# Altium footprint library con-samtec.PCBLIB: 805 footprints (part 46 of 55) (continued)
## TSW-139-02-S-Q [mm] (continued)
  rectangle: 12.35,2.19 13.05,2.89
  rectangle: 14.89,-2.89 15.59,-2.19
  rectangle: 14.89,2.19 15.59,2.89
  rectangle: 17.43,-2.89 18.13,-2.19
  rectangle: 17.43,2.19 18.13,2.89
  rectangle: 19.97,-2.89 20.67,-2.19
  rectangle: 19.97,2.19 20.67,2.89
  rectangle: 22.51,-2.89 23.21,-2.19
  rectangle: 22.51,2.19 23.21,2.89
  rectangle: 25.05,-2.89 25.75,-2.19
  rectangle: 25.05,2.19 25.75,2.89
  rectangle: 27.59,-2.89 28.29,-2.19
  rectangle: 27.59,2.19 28.29,2.89
  rectangle: 30.13,-2.89 30.83,-2.19
  rectangle: 30.13,2.19 30.83,2.89
  rectangle: 32.67,-2.89 33.37,-2.19
  rectangle: 32.67,2.19 33.37,2.89
  rectangle: 35.21,-2.89 35.91,-2.19
  rectangle: 35.21,2.19 35.91,2.89
  rectangle: 37.75,-2.89 38.45,-2.19
  rectangle: 37.75,2.19 38.45,2.89
  rectangle: 40.29,-2.89 40.99,-2.19
  rectangle: 40.29,2.19 40.99,2.89
  rectangle: 42.83,-2.89 43.53,-2.19
  rectangle: 42.83,2.19 43.53,2.89
  rectangle: 45.37,-2.89 46.07,-2.19
  rectangle: 45.37,2.19 46.07,2.89
  rectangle: 47.91,-2.89 48.61,-2.19
  rectangle: 47.91,2.19 48.61,2.89

## TSW-139-02-S-Q-RA [mil]
pads (78):
  oct 59.06x59.06 hole 39.37: 1(1900,60) 2(1900,260) 3(1800,60) 4(1800,260) 5(1700,60) 6(1700,260) 7(1600,60) 8(1600,260) 9(1500,60) 10(1500,260) 11(1400,60) 12(1400,260) 13(1300,60) 14(1300,260) 15(1200,60) 16(1200,260) 17(1100,60) 18(1100,260) 19(1000,60) 20(1000,260) 21(900,60) 22(900,260) 23(800,60) 24(800,260) 25(700,60) 26(700,260) 27(600,60) 28(600,260) 29(500,60) 30(500,260) 31(400,60) 32(400,260) 33(300,60) 34(300,260) 35(200,60) 36(200,260) 37(100,60) 38(100,260) 39(0,60) 40(0,260) 41(-100,60) 42(-100,260) 43(-200,60) 44(-200,260) 45(-300,60) 46(-300,260) 47(-400,60) 48(-400,260) 49(-500,60) 50(-500,260) 51(-600,60) 52(-600,260) 53(-700,60) 54(-700,260) 55(-800,60) 56(-800,260) 57(-900,60) 58(-900,260) 59(-1000,60) 60(-1000,260) 61(-1100,60) 62(-1100,260) 63(-1200,60) 64(-1200,260) 65(-1300,60) 66(-1300,260) 67(-1400,60) 68(-1400,260) 69(-1500,60) 70(-1500,260) 71(-1600,60) 72(-1600,260) 73(-1700,60) 74(-1700,260) 75(-1800,60) 76(-1800,260) 77(-1900,60) 78(-1900,260)
Top Overlay:
  rectangle: -1910,-310.63 -1890,-80.32
  rectangle: -1810,-310.63 -1790,-80.32
  rectangle: -1710,-310.63 -1690,-80.32
  rectangle: -1610,-310.63 -1590,-80.32
  rectangle: -1510,-310.63 -1490,-80.32
  rectangle: -1410,-310.63 -1390,-80.32
  rectangle: -1310,-310.63 -1290,-80.32
  rectangle: -1210,-310.63 -1190,-80.32
  rectangle: -1110,-310.63 -1090,-80.32
  rectangle: -1010,-310.63 -990,-80.32
  rectangle: -910,-310.63 -890,-80.32
  rectangle: -810,-310.63 -790,-80.32
  rectangle: -710,-310.63 -690,-80.32
  rectangle: -610,-310.63 -590,-80.32
  rectangle: -510,-310.63 -490,-80.32
  rectangle: -410,-310.63 -390,-80.32
  rectangle: -310,-310.63 -290,-80.32
  rectangle: -210,-310.63 -190,-80.32
  rectangle: -110,-310.63 -90,-80.32
  rectangle: -10,-310.63 10,-80.32
  rectangle: 90,-310.63 110,-80.32
  rectangle: 190,-310.63 210,-80.32
  rectangle: 290,-310.63 310,-80.32
  rectangle: 390,-310.63 410,-80.32
  rectangle: 490,-310.63 510,-80.32
  rectangle: 590,-310.63 610,-80.32
  rectangle: 690,-310.63 710,-80.32
  rectangle: 790,-310.63 810,-80.32
  rectangle: 890,-310.63 910,-80.32
  rectangle: 990,-310.63 1010,-80.32
  rectangle: 1090,-310.63 1110,-80.32
  rectangle: 1190,-310.63 1210,-80.32
  rectangle: 1290,-310.63 1310,-80.32
  rectangle: 1390,-310.63 1410,-80.32
  rectangle: 1490,-310.63 1510,-80.32
  rectangle: 1590,-310.63 1610,-80.32
  rectangle: 1690,-310.63 1710,-80.32
  rectangle: 1790,-310.63 1810,-80.32
  rectangle: 1890,-310.63 1910,-80.32
  lines w8: -1955.08,-80.55 1955.08,-80.55 1955.08,-4.17 -1955.08,-4.17 -1955.08,-80.55
  text "1" at 1953.54,43.31 h36.81
  text "2" at 1951.18,242.72 h36.81
Mechanical 16:
  rectangle: -1910,0 -1890,270
  rectangle: -1810,0 -1790,270
  rectangle: -1710,0 -1690,270
  rectangle: -1610,0 -1590,270
  rectangle: -1510,0 -1490,270
  rectangle: -1410,0 -1390,270
  rectangle: -1310,0 -1290,270
  rectangle: -1210,0 -1190,270
  rectangle: -1110,0 -1090,270
  rectangle: -1010,0 -990,270
  rectangle: -910,0 -890,270
  rectangle: -810,0 -790,270
  rectangle: -710,0 -690,270
  rectangle: -610,0 -590,270
  rectangle: -510,0 -490,270
  rectangle: -410,0 -390,270
  rectangle: -310,0 -290,270
  rectangle: -210,0 -190,270
  rectangle: -110,0 -90,270
  rectangle: -10,0 10,270
  rectangle: 90,0 110,270
  rectangle: 190,0 210,270
  rectangle: 290,0 310,270
  rectangle: 390,0 410,270
  rectangle: 490,0 510,270
  rectangle: 590,0 610,270
  rectangle: 690,0 710,270
  rectangle: 790,0 810,270
  rectangle: 890,0 910,270
  rectangle: 990,0 1010,270
  rectangle: 1090,0 1110,270
  rectangle: 1190,0 1210,270
  rectangle: 1290,0 1310,270
  rectangle: 1390,0 1410,270
  rectangle: 1490,0 1510,270
  rectangle: 1590,0 1610,270
  rectangle: 1690,0 1710,270
  rectangle: 1790,0 1810,270
  rectangle: 1890,0 1910,270

## TSW-139-02-S-S [mm]
pads (39):
  oct 1.5x1.5 hole 1: 1(48.26,0) 2(45.72,0) 3(43.18,0) 4(40.64,0) 5(38.1,0) 6(35.56,0) 7(33.02,0) 8(30.48,0) 9(27.94,0) 10(25.4,0) 11(22.86,0) 12(20.32,0) 13(17.78,0) 14(15.24,0) 15(12.7,0) 16(10.16,0) 17(7.62,0) 18(5.08,0) 19(2.54,0) 20(0,0) 21(-2.54,0) 22(-5.08,0) 23(-7.62,0) 24(-10.16,0) 25(-12.7,0) 26(-15.24,0) 27(-17.78,0) 28(-20.32,0) 29(-22.86,0) 30(-25.4,0) 31(-27.94,0) 32(-30.48,0) 33(-33.02,0) 34(-35.56,0) 35(-38.1,0) 36(-40.64,0) 37(-43.18,0) 38(-45.72,0) 39(-48.26,0)
Top Overlay:
  lines w0.203: -49.659,-1.155 49.659,-1.155 49.659,1.155 -49.659,1.155 -49.659,-1.155
  text "1" at 48.002,-2.498 h0.94
Mechanical 16:
  rectangle: -48.61,-0.35 -47.91,0.35
  rectangle: -46.07,-0.35 -45.37,0.35
  rectangle: -43.53,-0.35 -42.83,0.35
  rectangle: -40.99,-0.35 -40.29,0.35
  rectangle: -38.45,-0.35 -37.75,0.35
  rectangle: -35.91,-0.35 -35.21,0.35
  rectangle: -33.37,-0.35 -32.67,0.35
  rectangle: -30.83,-0.35 -30.13,0.35
  rectangle: -28.29,-0.35 -27.59,0.35
  rectangle: -25.75,-0.35 -25.05,0.35
  rectangle: -23.21,-0.35 -22.51,0.35
  rectangle: -20.67,-0.35 -19.97,0.35
  rectangle: -18.13,-0.35 -17.43,0.35
  rectangle: -15.59,-0.35 -14.89,0.35
  rectangle: -13.05,-0.35 -12.35,0.35
  rectangle: -10.51,-0.35 -9.81,0.35
  rectangle: -7.97,-0.35 -7.27,0.35
  rectangle: -5.43,-0.35 -4.73,0.35
  rectangle: -2.89,-0.35 -2.19,0.35
  rectangle: -0.35,-0.35 0.35,0.35
  rectangle: 2.19,-0.35 2.89,0.35
  rectangle: 4.73,-0.35 5.43,0.35
  rectangle: 7.27,-0.35 7.97,0.35
  rectangle: 9.81,-0.35 10.51,0.35
  rectangle: 12.35,-0.35 13.05,0.35
  rectangle: 14.89,-0.35 15.59,0.35
  rectangle: 17.43,-0.35 18.13,0.35
  rectangle: 19.97,-0.35 20.67,0.35
  rectangle: 22.51,-0.35 23.21,0.35
  rectangle: 25.05,-0.35 25.75,0.35
  rectangle: 27.59,-0.35 28.29,0.35
  rectangle: 30.13,-0.35 30.83,0.35
  rectangle: 32.67,-0.35 33.37,0.35
  rectangle: 35.21,-0.35 35.91,0.35
  rectangle: 37.75,-0.35 38.45,0.35
  rectangle: 40.29,-0.35 40.99,0.35
  rectangle: 42.83,-0.35 43.53,0.35
  rectangle: 45.37,-0.35 46.07,0.35
  rectangle: 47.91,-0.35 48.61,0.35

## TSW-139-02-S-S-RA [mil]
pads (39):
  oct 59.06x59.06 hole 39.37: 1(1900,60) 2(1800,60) 3(1700,60) 4(1600,60) 5(1500,60) 6(1400,60) 7(1300,60) 8(1200,60) 9(1100,60) 10(1000,60) 11(900,60) 12(800,60) 13(700,60) 14(600,60) 15(500,60) 16(400,60) 17(300,60) 18(200,60) 19(100,60) 20(0,60) 21(-100,60) 22(-200,60) 23(-300,60) 24(-400,60) 25(-500,60) 26(-600,60) 27(-700,60) 28(-800,60) 29(-900,60) 30(-1000,60) 31(-1100,60) 32(-1200,60) 33(-1300,60) 34(-1400,60) 35(-1500,60) 36(-1600,60) 37(-1700,60) 38(-1800,60) 39(-1900,60)
Top Overlay:
  rectangle: -1910,-310.63 -1890,-80.32
  rectangle: -1810,-310.63 -1790,-80.32
  rectangle: -1710,-310.63 -1690,-80.32
  rectangle: -1610,-310.63 -1590,-80.32
  rectangle: -1510,-310.63 -1490,-80.32
  rectangle: -1410,-310.63 -1390,-80.32
  rectangle: -1310,-310.63 -1290,-80.32
  rectangle: -1210,-310.63 -1190,-80.32
  rectangle: -1110,-310.63 -1090,-80.32
  rectangle: -1010,-310.63 -990,-80.32
  rectangle: -910,-310.63 -890,-80.32
  rectangle: -810,-310.63 -790,-80.32
  rectangle: -710,-310.63 -690,-80.32
  rectangle: -610,-310.63 -590,-80.32
  rectangle: -510,-310.63 -490,-80.32
  rectangle: -410,-310.63 -390,-80.32
  rectangle: -310,-310.63 -290,-80.32
  rectangle: -210,-310.63 -190,-80.32
  rectangle: -110,-310.63 -90,-80.32
  rectangle: -10,-310.63 10,-80.32
  rectangle: 90,-310.63 110,-80.32
  rectangle: 190,-310.63 210,-80.32
  rectangle: 290,-310.63 310,-80.32
  rectangle: 390,-310.63 410,-80.32
  rectangle: 490,-310.63 510,-80.32
  rectangle: 590,-310.63 610,-80.32
  rectangle: 690,-310.63 710,-80.32
  rectangle: 790,-310.63 810,-80.32
  rectangle: 890,-310.63 910,-80.32
  rectangle: 990,-310.63 1010,-80.32
  rectangle: 1090,-310.63 1110,-80.32
  rectangle: 1190,-310.63 1210,-80.32
  rectangle: 1290,-310.63 1310,-80.32
  rectangle: 1390,-310.63 1410,-80.32
  rectangle: 1490,-310.63 1510,-80.32
  rectangle: 1590,-310.63 1610,-80.32
  rectangle: 1690,-310.63 1710,-80.32
  rectangle: 1790,-310.63 1810,-80.32
  rectangle: 1890,-310.63 1910,-80.32
  lines w8: -1955.08,-80.55 1955.08,-80.55 1955.08,-4.17 -1955.08,-4.17 -1955.08,-80.55
  text "1" at 1950.47,45.35 h36.81
Mechanical 16:
  rectangle: -1910,0 -1890,70
  rectangle: -1810,0 -1790,70
  rectangle: -1710,0 -1690,70
  rectangle: -1610,0 -1590,70
  rectangle: -1510,0 -1490,70
  rectangle: -1410,0 -1390,70
  rectangle: -1310,0 -1290,70
  rectangle: -1210,0 -1190,70
  rectangle: -1110,0 -1090,70
  rectangle: -1010,0 -990,70
  rectangle: -910,0 -890,70
  rectangle: -810,0 -790,70
  rectangle: -710,0 -690,70
  rectangle: -610,0 -590,70
  rectangle: -510,0 -490,70
  rectangle: -410,0 -390,70
  rectangle: -310,0 -290,70
  rectangle: -210,0 -190,70
  rectangle: -110,0 -90,70
  rectangle: -10,0 10,70
  rectangle: 90,0 110,70
  rectangle: 190,0 210,70
  rectangle: 290,0 310,70
  rectangle: 390,0 410,70
  rectangle: 490,0 510,70
  rectangle: 590,0 610,70
  rectangle: 690,0 710,70
  rectangle: 790,0 810,70
  rectangle: 890,0 910,70
  rectangle: 990,0 1010,70
  rectangle: 1090,0 1110,70
  rectangle: 1190,0 1210,70
  rectangle: 1290,0 1310,70
  rectangle: 1390,0 1410,70
  rectangle: 1490,0 1510,70
  rectangle: 1590,0 1610,70
  rectangle: 1690,0 1710,70
  rectangle: 1790,0 1810,70
  rectangle: 1890,0 1910,70

## TSW-139-02-S-T [mm]
pads (117):
  oct 1.5x1.5 hole 1: 1(48.26,-2.54) 2(48.26,0) 3(48.26,2.54) 4(45.72,-2.54) 5(45.72,0) 6(45.72,2.54) 7(43.18,-2.54) 8(43.18,0) 9(43.18,2.54) 10(40.64,-2.54) 11(40.64,0) 12(40.64,2.54) 13(38.1,-2.54) 14(38.1,0) 15(38.1,2.54) 16(35.56,-2.54) 17(35.56,0) 18(35.56,2.54) 19(33.02,-2.54) 20(33.02,0) 21(33.02,2.54) 22(30.48,-2.54) 23(30.48,0) 24(30.48,2.54) 25(27.94,-2.54) 26(27.94,0) 27(27.94,2.54) 28(25.4,-2.54) 29(25.4,0) 30(25.4,2.54) 31(22.86,-2.54) 32(22.86,0) 33(22.86,2.54) 34(20.32,-2.54) 35(20.32,0) 36(20.32,2.54) 37(17.78,-2.54) 38(17.78,0) 39(17.78,2.54) 40(15.24,-2.54) 41(15.24,0) 42(15.24,2.54) 43(12.7,-2.54) 44(12.7,0) 45(12.7,2.54) 46(10.16,-2.54) 47(10.16,0) 48(10.16,2.54) 49(7.62,-2.54) 50(7.62,0) 51(7.62,2.54) 52(5.08,-2.54) 53(5.08,0) 54(5.08,2.54) 55(2.54,-2.54) 56(2.54,0) 57(2.54,2.54) 58(0,-2.54) 59(0,0) 60(0,2.54) 61(-2.54,-2.54) 62(-2.54,0) 63(-2.54,2.54) 64(-5.08,-2.54) 65(-5.08,0) 66(-5.08,2.54) 67(-7.62,-2.54) 68(-7.62,0) 69(-7.62,2.54) 70(-10.16,-2.54) 71(-10.16,0) 72(-10.16,2.54) 73(-12.7,-2.54) 74(-12.7,0) 75(-12.7,2.54) 76(-15.24,-2.54) 77(-15.24,0) 78(-15.24,2.54) 79(-17.78,-2.54) 80(-17.78,0) 81(-17.78,2.54) 82(-20.32,-2.54) 83(-20.32,0) 84(-20.32,2.54) 85(-22.86,-2.54) 86(-22.86,0) 87(-22.86,2.54) 88(-25.4,-2.54) 89(-25.4,0) 90(-25.4,2.54) 91(-27.94,-2.54) 92(-27.94,0) 93(-27.94,2.54) 94(-30.48,-2.54) 95(-30.48,0) 96(-30.48,2.54) 97(-33.02,-2.54) 98(-33.02,0) 99(-33.02,2.54) 100(-35.56,-2.54) 101(-35.56,0) 102(-35.56,2.54) 103(-38.1,-2.54) 104(-38.1,0) 105(-38.1,2.54) 106(-40.64,-2.54) 107(-40.64,0) 108(-40.64,2.54) 109(-43.18,-2.54) 110(-43.18,0) 111(-43.18,2.54) 112(-45.72,-2.54) 113(-45.72,0) 114(-45.72,2.54) 115(-48.26,-2.54) 116(-48.26,0) 117(-48.26,2.54)
Top Overlay:
  lines w0.203: -49.659,-3.695 49.659,-3.695 49.659,3.695 -49.659,3.695 -49.659,-3.695
  text "1" at 47.952,-5.188 h0.94
  text "3" at 47.948,3.989 h0.94
Mechanical 16:
  rectangle: -48.61,-2.89 -47.91,-2.19
  rectangle: -48.61,-0.35 -47.91,0.35
  rectangle: -48.61,2.19 -47.91,2.89
  rectangle: -46.07,-2.89 -45.37,-2.19
  rectangle: -46.07,-0.35 -45.37,0.35
  rectangle: -46.07,2.19 -45.37,2.89
  rectangle: -43.53,-2.89 -42.83,-2.19
  rectangle: -43.53,-0.35 -42.83,0.35
  rectangle: -43.53,2.19 -42.83,2.89
  rectangle: -40.99,-2.89 -40.29,-2.19
  rectangle: -40.99,-0.35 -40.29,0.35
  rectangle: -40.99,2.19 -40.29,2.89
  rectangle: -38.45,-2.89 -37.75,-2.19
  rectangle: -38.45,-0.35 -37.75,0.35
  rectangle: -38.45,2.19 -37.75,2.89
  rectangle: -35.91,-2.89 -35.21,-2.19
  rectangle: -35.91,-0.35 -35.21,0.35
  rectangle: -35.91,2.19 -35.21,2.89
  rectangle: -33.37,-2.89 -32.67,-2.19
  rectangle: -33.37,-0.35 -32.67,0.35
  rectangle: -33.37,2.19 -32.67,2.89
  rectangle: -30.83,-2.89 -30.13,-2.19
  rectangle: -30.83,-0.35 -30.13,0.35
  rectangle: -30.83,2.19 -30.13,2.89
  rectangle: -28.29,-2.89 -27.59,-2.19
  rectangle: -28.29,-0.35 -27.59,0.35
  rectangle: -28.29,2.19 -27.59,2.89
  rectangle: -25.75,-2.89 -25.05,-2.19
  rectangle: -25.75,-0.35 -25.05,0.35
  rectangle: -25.75,2.19 -25.05,2.89
  rectangle: -23.21,-2.89 -22.51,-2.19
  rectangle: -23.21,-0.35 -22.51,0.35
  rectangle: -23.21,2.19 -22.51,2.89
  rectangle: -20.67,-2.89 -19.97,-2.19
  rectangle: -20.67,-0.35 -19.97,0.35
  rectangle: -20.67,2.19 -19.97,2.89
  rectangle: -18.13,-2.89 -17.43,-2.19
  rectangle: -18.13,-0.35 -17.43,0.35
  rectangle: -18.13,2.19 -17.43,2.89
  rectangle: -15.59,-2.89 -14.89,-2.19
  rectangle: -15.59,-0.35 -14.89,0.35
  rectangle: -15.59,2.19 -14.89,2.89
  rectangle: -13.05,-2.89 -12.35,-2.19
  rectangle: -13.05,-0.35 -12.35,0.35
  rectangle: -13.05,2.19 -12.35,2.89
  rectangle: -10.51,-2.89 -9.81,-2.19
  rectangle: -10.51,-0.35 -9.81,0.35
  rectangle: -10.51,2.19 -9.81,2.89
  rectangle: -7.97,-2.89 -7.27,-2.19
  rectangle: -7.97,-0.35 -7.27,0.35
  rectangle: -7.97,2.19 -7.27,2.89
  rectangle: -5.43,-2.89 -4.73,-2.19
  rectangle: -5.43,-0.35 -4.73,0.35
  rectangle: -5.43,2.19 -4.73,2.89
  rectangle: -2.89,-2.89 -2.19,-2.19
  rectangle: -2.89,-0.35 -2.19,0.35
  rectangle: -2.89,2.19 -2.19,2.89
  rectangle: -0.35,-2.89 0.35,-2.19
  rectangle: -0.35,-0.35 0.35,0.35
  rectangle: -0.35,2.19 0.35,2.89
  rectangle: 2.19,-2.89 2.89,-2.19
  rectangle: 2.19,-0.35 2.89,0.35
  rectangle: 2.19,2.19 2.89,2.89
  rectangle: 4.73,-2.89 5.43,-2.19
  rectangle: 4.73,-0.35 5.43,0.35
  rectangle: 4.73,2.19 5.43,2.89
  rectangle: 7.27,-2.89 7.97,-2.19
  rectangle: 7.27,-0.35 7.97,0.35
  rectangle: 7.27,2.19 7.97,2.89
  rectangle: 9.81,-2.89 10.51,-2.19
  rectangle: 9.81,-0.35 10.51,0.35
  rectangle: 9.81,2.19 10.51,2.89
  rectangle: 12.35,-2.89 13.05,-2.19
  rectangle: 12.35,-0.35 13.05,0.35
  rectangle: 12.35,2.19 13.05,2.89
  rectangle: 14.89,-2.89 15.59,-2.19
  rectangle: 14.89,-0.35 15.59,0.35
  rectangle: 14.89,2.19 15.59,2.89
  rectangle: 17.43,-2.89 18.13,-2.19
  rectangle: 17.43,-0.35 18.13,0.35
  rectangle: 17.43,2.19 18.13,2.89
  rectangle: 19.97,-2.89 20.67,-2.19
  rectangle: 19.97,-0.35 20.67,0.35
  rectangle: 19.97,2.19 20.67,2.89
  rectangle: 22.51,-2.89 23.21,-2.19
  rectangle: 22.51,-0.35 23.21,0.35
  rectangle: 22.51,2.19 23.21,2.89
  rectangle: 25.05,-2.89 25.75,-2.19
  rectangle: 25.05,-0.35 25.75,0.35
  rectangle: 25.05,2.19 25.75,2.89
  rectangle: 27.59,-2.89 28.29,-2.19
  rectangle: 27.59,-0.35 28.29,0.35
  rectangle: 27.59,2.19 28.29,2.89
  rectangle: 30.13,-2.89 30.83,-2.19
  rectangle: 30.13,-0.35 30.83,0.35
  rectangle: 30.13,2.19 30.83,2.89
  rectangle: 32.67,-2.89 33.37,-2.19
  rectangle: 32.67,-0.35 33.37,0.35
  rectangle: 32.67,2.19 33.37,2.89
  rectangle: 35.21,-2.89 35.91,-2.19
  rectangle: 35.21,-0.35 35.91,0.35
  rectangle: 35.21,2.19 35.91,2.89
  rectangle: 37.75,-2.89 38.45,-2.19
  rectangle: 37.75,-0.35 38.45,0.35
  rectangle: 37.75,2.19 38.45,2.89
  rectangle: 40.29,-2.89 40.99,-2.19
  rectangle: 40.29,-0.35 40.99,0.35
  rectangle: 40.29,2.19 40.99,2.89
  rectangle: 42.83,-2.89 43.53,-2.19
  rectangle: 42.83,-0.35 43.53,0.35
  rectangle: 42.83,2.19 43.53,2.89
  rectangle: 45.37,-2.89 46.07,-2.19
  rectangle: 45.37,-0.35 46.07,0.35
  rectangle: 45.37,2.19 46.07,2.89
  rectangle: 47.91,-2.89 48.61,-2.19
  rectangle: 47.91,-0.35 48.61,0.35
  rectangle: 47.91,2.19 48.61,2.89

## TSW-139-02-S-T-RA [mil]
pads (117):
  oct 59.06x59.06 hole 39.37: 1(1900,60) 2(1900,160) 3(1900,260) 4(1800,60) 5(1800,160) 6(1800,260) 7(1700,60) 8(1700,160) 9(1700,260) 10(1600,60) 11(1600,160) 12(1600,260) 13(1500,60) 14(1500,160) 15(1500,260) 16(1400,60) 17(1400,160) 18(1400,260) 19(1300,60) 20(1300,160) 21(1300,260) 22(1200,60) 23(1200,160) 24(1200,260) 25(1100,60) 26(1100,160) 27(1100,260) 28(1000,60) 29(1000,160) 30(1000,260) 31(900,60) 32(900,160) 33(900,260) 34(800,60) 35(800,160) 36(800,260) 37(700,60) 38(700,160) 39(700,260) 40(600,60) 41(600,160) 42(600,260) 43(500,60) 44(500,160) 45(500,260) 46(400,60) 47(400,160) 48(400,260) 49(300,60) 50(300,160) 51(300,260) 52(200,60) 53(200,160) 54(200,260) 55(100,60) 56(100,160) 57(100,260) 58(0,60) 59(0,160) 60(0,260) 61(-100,60) 62(-100,160) 63(-100,260) 64(-200,60) 65(-200,160) 66(-200,260) 67(-300,60) 68(-300,160) 69(-300,260) 70(-400,60) 71(-400,160) 72(-400,260) 73(-500,60) 74(-500,160) 75(-500,260) 76(-600,60) 77(-600,160) 78(-600,260) 79(-700,60) 80(-700,160) 81(-700,260) 82(-800,60) 83(-800,160) 84(-800,260) 85(-900,60) 86(-900,160) 87(-900,260) 88(-1000,60) 89(-1000,160) 90(-1000,260) 91(-1100,60) 92(-1100,160) 93(-1100,260) 94(-1200,60) 95(-1200,160) 96(-1200,260) 97(-1300,60) 98(-1300,160) 99(-1300,260) 100(-1400,60) 101(-1400,160) 102(-1400,260) 103(-1500,60) 104(-1500,160) 105(-1500,260) 106(-1600,60) 107(-1600,160) 108(-1600,260) 109(-1700,60) 110(-1700,160) 111(-1700,260) 112(-1800,60) 113(-1800,160) 114(-1800,260) 115(-1900,60) 116(-1900,160) 117(-1900,260)
Top Overlay:
  rectangle: -1910,-310.63 -1890,-80.32
  rectangle: -1810,-310.63 -1790,-80.32
  rectangle: -1710,-310.63 -1690,-80.32
  rectangle: -1610,-310.63 -1590,-80.32
  rectangle: -1510,-310.63 -1490,-80.32
  rectangle: -1410,-310.63 -1390,-80.32
  rectangle: -1310,-310.63 -1290,-80.32
  rectangle: -1210,-310.63 -1190,-80.32
  rectangle: -1110,-310.63 -1090,-80.32
  rectangle: -1010,-310.63 -990,-80.32
  rectangle: -910,-310.63 -890,-80.32
  rectangle: -810,-310.63 -790,-80.32
  rectangle: -710,-310.63 -690,-80.32
  rectangle: -610,-310.63 -590,-80.32
  rectangle: -510,-310.63 -490,-80.32
  rectangle: -410,-310.63 -390,-80.32
  rectangle: -310,-310.63 -290,-80.32
  rectangle: -210,-310.63 -190,-80.32
  rectangle: -110,-310.63 -90,-80.32
  rectangle: -10,-310.63 10,-80.32
  rectangle: 90,-310.63 110,-80.32
  rectangle: 190,-310.63 210,-80.32
  rectangle: 290,-310.63 310,-80.32
  rectangle: 390,-310.63 410,-80.32
  rectangle: 490,-310.63 510,-80.32
  rectangle: 590,-310.63 610,-80.32
  rectangle: 690,-310.63 710,-80.32
  rectangle: 790,-310.63 810,-80.32
  rectangle: 890,-310.63 910,-80.32
  rectangle: 990,-310.63 1010,-80.32
  rectangle: 1090,-310.63 1110,-80.32
  rectangle: 1190,-310.63 1210,-80.32
  rectangle: 1290,-310.63 1310,-80.32
  rectangle: 1390,-310.63 1410,-80.32
  rectangle: 1490,-310.63 1510,-80.32
  rectangle: 1590,-310.63 1610,-80.32
  rectangle: 1690,-310.63 1710,-80.32
  rectangle: 1790,-310.63 1810,-80.32
  rectangle: 1890,-310.63 1910,-80.32
  lines w8: -1955.08,-80.55 1955.08,-80.55 1955.08,-4.17 -1955.08,-4.17 -1955.08,-80.55
  text "1" at 1951.57,41.34 h36.81
  text "3" at 1952.17,236.81 h36.81
Mechanical 16:
  rectangle: -1910,0 -1890,270
  rectangle: -1810,0 -1790,270
  rectangle: -1710,0 -1690,270
  rectangle: -1610,0 -1590,270
  rectangle: -1510,0 -1490,270
  rectangle: -1410,0 -1390,270
  rectangle: -1310,0 -1290,270
  rectangle: -1210,0 -1190,270
  rectangle: -1110,0 -1090,270
  rectangle: -1010,0 -990,270
  rectangle: -910,0 -890,270
  rectangle: -810,0 -790,270
  rectangle: -710,0 -690,270
  rectangle: -610,0 -590,270
  rectangle: -510,0 -490,270
  rectangle: -410,0 -390,270
  rectangle: -310,0 -290,270
  rectangle: -210,0 -190,270
  rectangle: -110,0 -90,270
  rectangle: -10,0 10,270
  rectangle: 90,0 110,270
  rectangle: 190,0 210,270
  rectangle: 290,0 310,270
  rectangle: 390,0 410,270
  rectangle: 490,0 510,270
  rectangle: 590,0 610,270
  rectangle: 690,0 710,270
  rectangle: 790,0 810,270
  rectangle: 890,0 910,270
  rectangle: 990,0 1010,270
  rectangle: 1090,0 1110,270
  rectangle: 1190,0 1210,270
  rectangle: 1290,0 1310,270
  rectangle: 1390,0 1410,270
  rectangle: 1490,0 1510,270
  rectangle: 1590,0 1610,270
  rectangle: 1690,0 1710,270
  rectangle: 1790,0 1810,270
  rectangle: 1890,0 1910,270

## TSW-140-02-S-D [mm]
pads (80):
  oct 1.5x1.5 hole 1: 1(49.53,-1.27) 2(49.53,1.27) 3(46.99,-1.27) 4(46.99,1.27) 5(44.45,-1.27) 6(44.45,1.27) 7(41.91,-1.27) 8(41.91,1.27) 9(39.37,-1.27) 10(39.37,1.27) 11(36.83,-1.27) 12(36.83,1.27) 13(34.29,-1.27) 14(34.29,1.27) 15(31.75,-1.27) 16(31.75,1.27) 17(29.21,-1.27) 18(29.21,1.27) 19(26.67,-1.27) 20(26.67,1.27) 21(24.13,-1.27) 22(24.13,1.27) 23(21.59,-1.27) 24(21.59,1.27) 25(19.05,-1.27) 26(19.05,1.27) 27(16.51,-1.27) 28(16.51,1.27) 29(13.97,-1.27) 30(13.97,1.27) 31(11.43,-1.27) 32(11.43,1.27) 33(8.89,-1.27) 34(8.89,1.27) 35(6.35,-1.27) 36(6.35,1.27) 37(3.81,-1.27) 38(3.81,1.27) 39(1.27,-1.27) 40(1.27,1.27) 41(-1.27,-1.27) 42(-1.27,1.27) 43(-3.81,-1.27) 44(-3.81,1.27) 45(-6.35,-1.27) 46(-6.35,1.27) 47(-8.89,-1.27) 48(-8.89,1.27) 49(-11.43,-1.27) 50(-11.43,1.27) 51(-13.97,-1.27) 52(-13.97,1.27) 53(-16.51,-1.27) 54(-16.51,1.27) 55(-19.05,-1.27) 56(-19.05,1.27) 57(-21.59,-1.27) 58(-21.59,1.27) 59(-24.13,-1.27) 60(-24.13,1.27) 61(-26.67,-1.27) 62(-26.67,1.27) 63(-29.21,-1.27) 64(-29.21,1.27) 65(-31.75,-1.27) 66(-31.75,1.27) 67(-34.29,-1.27) 68(-34.29,1.27) 69(-36.83,-1.27) 70(-36.83,1.27) 71(-39.37,-1.27) 72(-39.37,1.27) 73(-41.91,-1.27) 74(-41.91,1.27) 75(-44.45,-1.27) 76(-44.45,1.27) 77(-46.99,-1.27) 78(-46.99,1.27) 79(-49.53,-1.27) 80(-49.53,1.27)
Top Overlay:
  lines w0.203: -50.929,-2.425 50.929,-2.425 50.929,2.425 -50.929,2.425 -50.929,-2.425
  text "1" at 49.322,-3.818 h0.94
  text "2" at 49.147,2.744 h0.94
Mechanical 16:
  rectangle: -49.88,-1.62 -49.18,-0.92
  rectangle: -49.88,0.92 -49.18,1.62
  rectangle: -47.34,-1.62 -46.64,-0.92
  rectangle: -47.34,0.92 -46.64,1.62
  rectangle: -44.8,-1.62 -44.1,-0.92
  rectangle: -44.8,0.92 -44.1,1.62
  rectangle: -42.26,-1.62 -41.56,-0.92
  rectangle: -42.26,0.92 -41.56,1.62
  rectangle: -39.72,-1.62 -39.02,-0.92
  rectangle: -39.72,0.92 -39.02,1.62
  rectangle: -37.18,-1.62 -36.48,-0.92
  rectangle: -37.18,0.92 -36.48,1.62
  rectangle: -34.64,-1.62 -33.94,-0.92
  rectangle: -34.64,0.92 -33.94,1.62
  rectangle: -32.1,-1.62 -31.4,-0.92
  rectangle: -32.1,0.92 -31.4,1.62
  rectangle: -29.56,-1.62 -28.86,-0.92
  rectangle: -29.56,0.92 -28.86,1.62
  rectangle: -27.02,-1.62 -26.32,-0.92
  rectangle: -27.02,0.92 -26.32,1.62
  rectangle: -24.48,-1.62 -23.78,-0.92
  rectangle: -24.48,0.92 -23.78,1.62
  rectangle: -21.94,-1.62 -21.24,-0.92
  rectangle: -21.94,0.92 -21.24,1.62
  rectangle: -19.4,-1.62 -18.7,-0.92
  rectangle: -19.4,0.92 -18.7,1.62
  rectangle: -16.86,-1.62 -16.16,-0.92
  rectangle: -16.86,0.92 -16.16,1.62
  rectangle: -14.32,-1.62 -13.62,-0.92
  rectangle: -14.32,0.92 -13.62,1.62
  rectangle: -11.78,-1.62 -11.08,-0.92
  rectangle: -11.78,0.92 -11.08,1.62
  rectangle: -9.24,-1.62 -8.54,-0.92
  rectangle: -9.24,0.92 -8.54,1.62
  rectangle: -6.7,-1.62 -6,-0.92
  rectangle: -6.7,0.92 -6,1.62
  rectangle: -4.16,-1.62 -3.46,-0.92
  rectangle: -4.16,0.92 -3.46,1.62
  rectangle: -1.62,-1.62 -0.92,-0.92
  rectangle: -1.62,0.92 -0.92,1.62
  rectangle: 0.92,-1.62 1.62,-0.92
  rectangle: 0.92,0.92 1.62,1.62
  rectangle: 3.46,-1.62 4.16,-0.92
  rectangle: 3.46,0.92 4.16,1.62
  rectangle: 6,-1.62 6.7,-0.92
  rectangle: 6,0.92 6.7,1.62
  rectangle: 8.54,-1.62 9.24,-0.92
  rectangle: 8.54,0.92 9.24,1.62
  rectangle: 11.08,-1.62 11.78,-0.92
  rectangle: 11.08,0.92 11.78,1.62
  rectangle: 13.62,-1.62 14.32,-0.92
  rectangle: 13.62,0.92 14.32,1.62
  rectangle: 16.16,-1.62 16.86,-0.92
  rectangle: 16.16,0.92 16.86,1.62
  rectangle: 18.7,-1.62 19.4,-0.92
  rectangle: 18.7,0.92 19.4,1.62
  rectangle: 21.24,-1.62 21.94,-0.92
  rectangle: 21.24,0.92 21.94,1.62
  rectangle: 23.78,-1.62 24.48,-0.92
  rectangle: 23.78,0.92 24.48,1.62
  rectangle: 26.32,-1.62 27.02,-0.92
  rectangle: 26.32,0.92 27.02,1.62
  rectangle: 28.86,-1.62 29.56,-0.92
  rectangle: 28.86,0.92 29.56,1.62
  rectangle: 31.4,-1.62 32.1,-0.92
  rectangle: 31.4,0.92 32.1,1.62
  rectangle: 33.94,-1.62 34.64,-0.92
  rectangle: 33.94,0.92 34.64,1.62
  rectangle: 36.48,-1.62 37.18,-0.92
  rectangle: 36.48,0.92 37.18,1.62
  rectangle: 39.02,-1.62 39.72,-0.92
  rectangle: 39.02,0.92 39.72,1.62
  rectangle: 41.56,-1.62 42.26,-0.92
  rectangle: 41.56,0.92 42.26,1.62
  rectangle: 44.1,-1.62 44.8,-0.92
  rectangle: 44.1,0.92 44.8,1.62
  rectangle: 46.64,-1.62 47.34,-0.92
  rectangle: 46.64,0.92 47.34,1.62
  rectangle: 49.18,-1.62 49.88,-0.92
  rectangle: 49.18,0.92 49.88,1.62